# Altium footprint library Chip_Packaging.PcbLib: 101 footprints (part 1 of 7)
Each footprint in its own frame and in the unit in brackets; x right, y up, seen from the top. Pads: shape width x height; smd on the part's side, far side on the other; paste and mask are expansions set on the pad; w line width, h text height; cw(c..) or ccw(c..) is an arc to the next point about the centre after c.
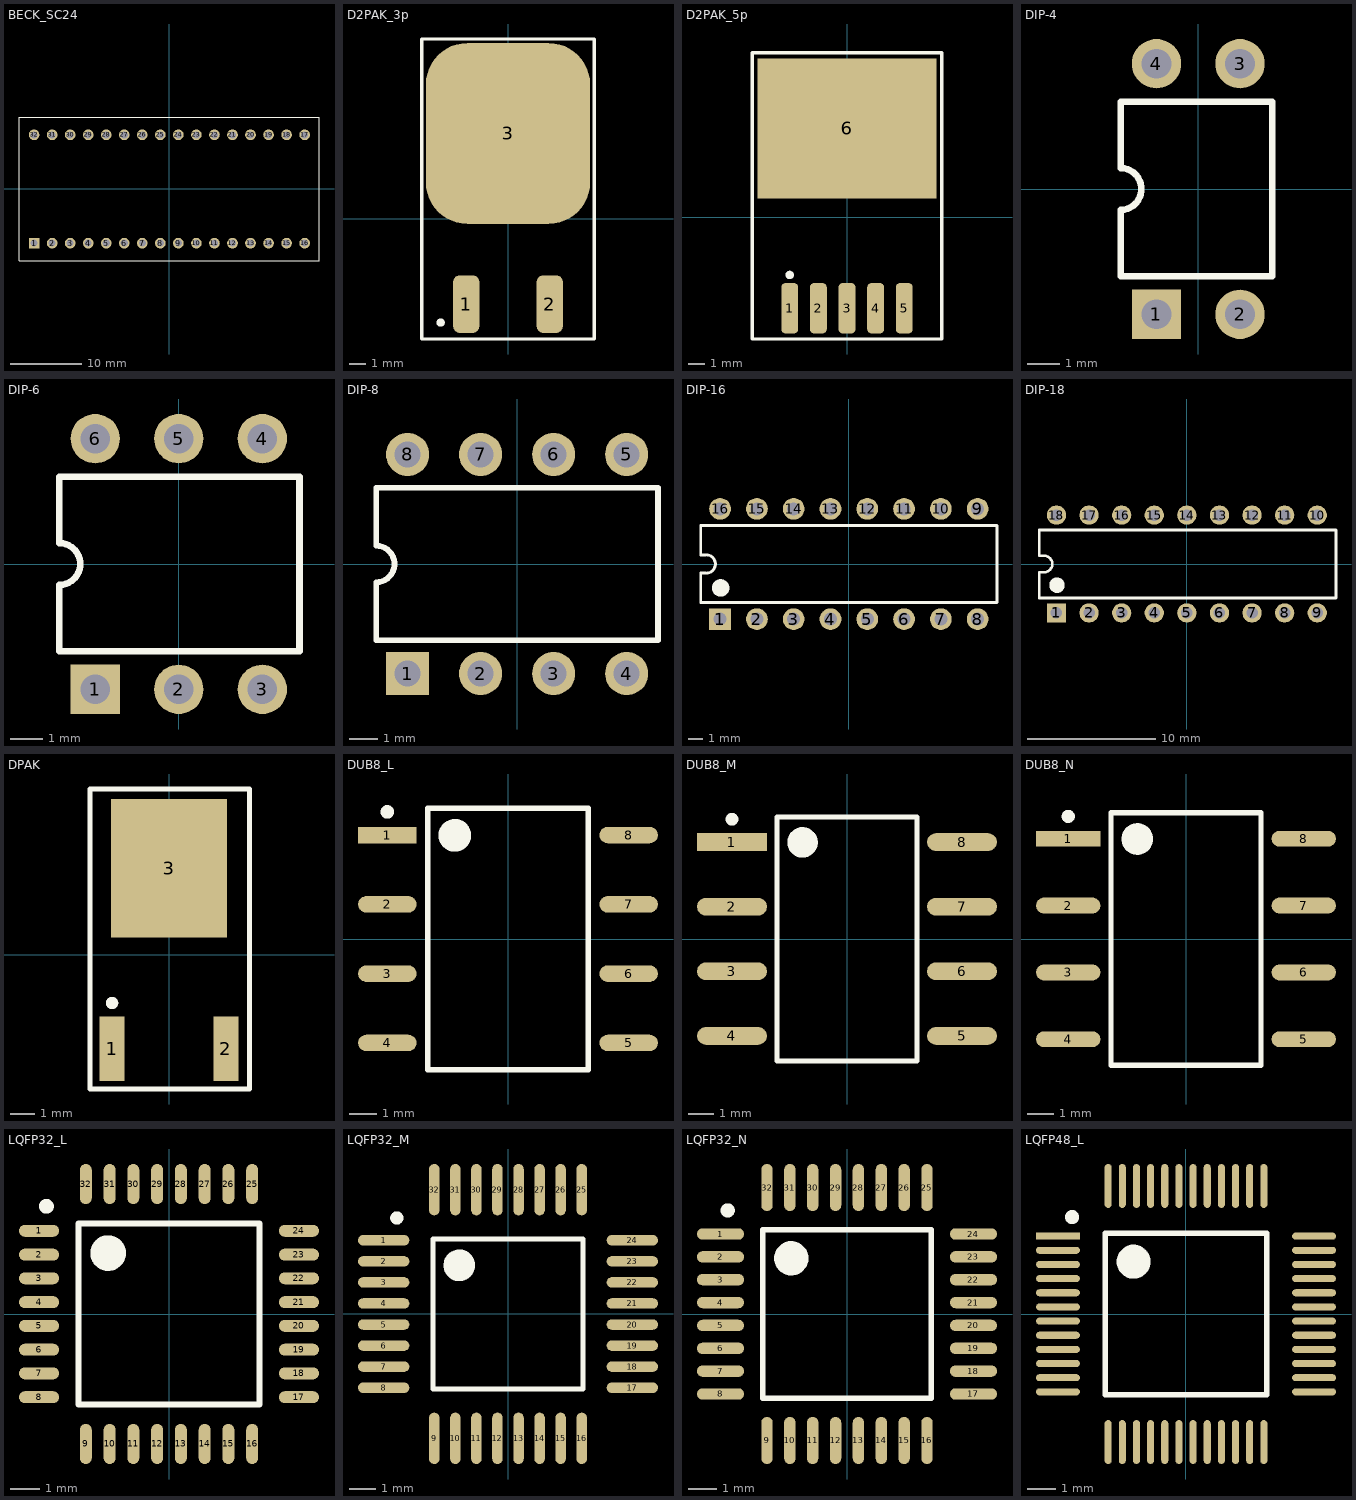
[diagram p0: the footprints below, top view; thin cyan lines are the x and y axes]

## BECK_SC24 [mm]
pads (32):
  rect 1.5x1.5 hole 1: 1(-19.05,-7.62)
  round 1.5 hole 1: 2(-16.51,-7.62) 3(-13.97,-7.62) 4(-11.43,-7.62) 5(-8.89,-7.62) 6(-6.35,-7.62) 7(-3.81,-7.62) 8(-1.27,-7.62) 9(1.27,-7.62) 10(3.81,-7.62) 11(6.35,-7.62) 12(8.89,-7.62) 13(11.43,-7.62) 14(13.97,-7.62) 15(16.51,-7.62) 16(19.05,-7.62) 17(19.05,7.62) 18(16.51,7.62) 19(13.97,7.62) 20(11.43,7.62) 21(8.89,7.62) 22(6.35,7.62) 23(3.81,7.62) 24(1.27,7.62) 25(-1.27,7.62) 26(-3.81,7.62) 27(-6.35,7.62) 28(-8.89,7.62) 29(-11.43,7.62) 30(-13.97,7.62) 31(-16.51,7.62) 32(-19.05,7.62)
Top Overlay:
  lines w0.1: -21.175,-10.125 -21.175,10.125 21.075,10.125 21.075,-10.125 -21.175,-10.125
3D body: height 9.5, standoff 8, extent 17,-5 20,-3.5
3D body: height 9.5, standoff 8, extent 5.5,-5 16,5.5
3D body: height 9.5, standoff 8, extent -5.5,-2.5 2.5,5
3D body: height 9.5, standoff 8, extent -17,-3.5 -9.5,4
3D body: height 8, standoff 6.5, extent -21.175,-10.125 21.075,10.125
3D body: height 6.5, standoff 0, extent 0.973,-7.919 1.57,-7.32
3D body: height 6.5, standoff 0, extent 3.513,-7.919 4.11,-7.32
3D body: height 6.5, standoff 0, extent 6.053,-7.919 6.65,-7.32
3D body: height 6.5, standoff 0, extent 8.593,-7.919 9.19,-7.32
3D body: height 6.5, standoff 0, extent -19.347,-7.919 -18.75,-7.32
3D body: height 6.5, standoff 0, extent -16.807,-7.919 -16.21,-7.32
3D body: height 6.5, standoff 0, extent -14.267,-7.919 -13.67,-7.32
3D body: height 6.5, standoff 0, extent -11.727,-7.919 -11.13,-7.32
3D body: height 6.5, standoff 0, extent -1.567,-7.919 -0.97,-7.32
3D body: height 6.5, standoff 0, extent -4.107,-7.919 -3.51,-7.32
3D body: height 6.5, standoff 0, extent -6.647,-7.919 -6.05,-7.32
3D body: height 6.5, standoff 0, extent -9.187,-7.919 -8.59,-7.32
3D body: height 6.5, standoff 0, extent 18.753,-7.919 19.35,-7.32
3D body: height 6.5, standoff 0, extent 16.213,-7.919 16.81,-7.32
3D body: height 6.5, standoff 0, extent 13.673,-7.919 14.27,-7.32
3D body: height 6.5, standoff 0, extent 11.133,-7.919 11.73,-7.32
3D body: height 6.5, standoff 0, extent 11.133,7.321 11.73,7.92
3D body: height 6.5, standoff 0, extent 13.673,7.321 14.27,7.92
3D body: height 6.5, standoff 0, extent 16.213,7.321 16.81,7.92
3D body: height 6.5, standoff 0, extent 18.753,7.321 19.35,7.92
3D body: height 6.5, standoff 0, extent -9.187,7.321 -8.59,7.92
3D body: height 6.5, standoff 0, extent -6.647,7.321 -6.05,7.92
3D body: height 6.5, standoff 0, extent -4.107,7.321 -3.51,7.92
3D body: height 6.5, standoff 0, extent -1.567,7.321 -0.97,7.92
3D body: height 6.5, standoff 0, extent -11.727,7.321 -11.13,7.92
3D body: height 6.5, standoff 0, extent -14.267,7.321 -13.67,7.92
3D body: height 6.5, standoff 0, extent -16.807,7.321 -16.21,7.92
3D body: height 6.5, standoff 0, extent -19.347,7.321 -18.75,7.92
3D body: height 6.5, standoff 0, extent 8.593,7.321 9.19,7.92
3D body: height 6.5, standoff 0, extent 6.053,7.321 6.65,7.92
3D body: height 6.5, standoff 0, extent 3.513,7.321 4.11,7.92
3D body: height 6.5, standoff 0, extent 0.973,7.321 1.57,7.92
3D body "DIP_panel_32.stp": height 4.3, standoff -3.07, extent -20.3,-8.85 20.3,8.85

## D2PAK_3p [mm] "D2-PAK; 5 Leads; Body 14.7 (inc. leads) x 10.2 mm (LxW max)"
height 4.58
pads (3):
  rrect50% 1.6x3.5 smd: 1(-2.54,-5.194) 2(2.54,-5.194)
  rrect50% 10x11 smd: 3(0,5.194)
Top Overlay:
  circle w0.25: c-4.1,-6.319 r0.125
  lines w0.2: -5.25,-7.319 5.25,-7.319 5.25,10.944 -5.25,10.944 -5.25,-7.319
3D body "D2PAK_3.STEP": height 4.88, standoff -0.13, extent -5.08,-5.835 5.08,9.429

## D2PAK_5p [mm] "D2-PAK; 5 Leads; Body 14.7 (inc. leads) x 10.2 mm (LxW max)"
height 4.58
pads (6):
  rrect50% 1x3 smd: 1(-3.4,-5.4) 2(-1.7,-5.4) 3(0,-5.4) 4(1.7,-5.4) 5(3.4,-5.4)
  rect 10.6x8.3 smd: 6(0,5.275)
Top Overlay:
  circle w0.25: c-3.4,-3.425 r0.125
  lines w0.2: -5.625,-7.225 5.625,-7.225 5.625,9.75 -5.625,9.75 -5.625,-7.225
3D body "D2PAK-5.STEP": height 4.78, standoff -0.02, extent -5,-6.59 5,9.08

## DIP-4 [mm]
height 4.2
pads (4):
  rect 1.5x1.5 hole 0.9: 1(-1.27,-3.81)
  round 1.5 hole 0.9: 2(1.27,-3.81) 3(1.27,3.81) 4(-1.27,3.81)
Top Overlay:
  lines w0.2: -2.36,-2.65 -2.36,-0.635 ccw(c-2.36,0) -2.36,0.635 -2.36,2.65 2.25,2.65 2.25,-2.65 -2.36,-2.65
3D body "DIP-4_DEFAULT.STEP": height 4.31, standoff -3.28, extent -2.815,-4.025 2.725,3.975

## DIP-6 [mm] "6-Pin Plastic Dual In-Line Package (PDIP)"
height 4.32
pads (6):
  rect 1.5x1.5 hole 0.9: 1(-2.54,-3.81)
  round 1.5 hole 0.9: 2(0,-3.81) 3(2.54,-3.81) 4(2.54,3.81) 5(0,3.81) 6(-2.54,3.81)
Top Overlay:
  lines w0.2: -3.63,-2.65 3.67,-2.65 3.67,2.65 -3.63,2.65 -3.63,0.635 cw(c-3.63,0) -3.63,-0.635 -3.63,-2.65
3D body "DIP-6.STEP": height 5.3, standoff -2, extent -3.53,-3.935 3.59,3.935

## DIP-8 [mm] "8-Pin Plastic Dual In-Line Package (PDIP)"
height 4.32
pads (8):
  rect 1.5x1.5 hole 0.9: 1(-3.81,-3.81)
  round 1.5 hole 0.9: 2(-1.27,-3.81) 3(1.27,-3.81) 4(3.81,-3.81) 5(3.81,3.81) 6(1.27,3.81) 7(-1.27,3.81) 8(-3.81,3.81)
Top Overlay:
  lines w0.2: -4.9,-2.65 -4.9,-0.635 ccw(c-4.9,0) -4.9,0.635 -4.9,2.65 4.9,2.65 4.9,-2.65 -4.9,-2.65
3D body "DIP-8.STEP": height 4.57, standoff -3.81, extent -4.955,-3.91 4.955,3.91

## DIP-16 [mm] "DIP, 16-Leads, Row Spacing 7.62mm, Pitch 2.54mm, Body 19.3x6.4mm"
height 5.08
pads (16):
  rect 1.5x1.5 hole 0.9: 1(-8.89,-3.81)
  round 1.5 hole 0.9: 2(-6.35,-3.81) 3(-3.81,-3.81) 4(-1.27,-3.81) 5(1.27,-3.81) 6(3.81,-3.81) 7(6.35,-3.81) 8(8.89,-3.81) 9(8.89,3.81) 10(6.35,3.81) 11(3.81,3.81) 12(1.27,3.81) 13(-1.27,3.81) 14(-3.81,3.81) 15(-6.35,3.81) 16(-8.89,3.81)
Top Overlay:
  circle w0.6: c-8.85,-1.65 r0.3
  lines w0.2: -10.225,-2.65 10.225,-2.65 10.225,2.65 -10.225,2.65 -10.225,0.635 -9.85,0.635 cw(c-9.85,0) -9.85,-0.635 -10.225,-0.635 -10.225,-2.65
3D body "DIP-16.STEP": height 4.5, standoff -3.5, extent -10.3,-3.88 10.3,3.88

## DIP-18 [mm] "DIP, 18-Leads, Row Spacing 7.62mm, Pitch 2.54mm, Body 19.3x6.4mm"
height 5.08
pads (18):
  rect 1.5x1.5 hole 0.9: 1(-10.16,-3.81)
  round 1.5 hole 0.9: 2(-7.62,-3.81) 3(-5.08,-3.81) 4(-2.54,-3.81) 5(0,-3.81) 6(2.54,-3.81) 7(5.08,-3.81) 8(7.62,-3.81) 9(10.16,-3.81) 10(10.16,3.81) 11(7.62,3.81) 12(5.08,3.81) 13(2.54,3.81) 14(0,3.81) 15(-2.54,3.81) 16(-5.08,3.81) 17(-7.62,3.81) 18(-10.16,3.81)
Top Overlay:
  circle w0.6: c-10.12,-1.65 r0.3
  lines w0.2: -11.5,0.635 -11.12,0.635 cw(c-11.12,0) -11.12,-0.635 -11.495,-0.635 -11.495,-2.65 11.62,-2.65 11.62,2.65 -11.5,2.65 -11.5,0.635
3D body "DIP-18.STEP": height 4.57, standoff -3.81, extent -11.62,-3.91 11.62,3.91

## DPAK [mm] "D2-PAK; 3"
height 4.58
pads (3):
  rect 1x2.6 smd: 1(-2.3,-3.8) 2(2.3,-3.8)
  rect 4.7x5.6 smd: 3(0,3.5)
Top Overlay:
  circle w0.25: c-2.3,-1.95 r0.125
  lines w0.2: -3.2,-5.425 3.25,-5.425 3.25,6.7 -3.2,6.7 -3.2,-5.425
3D body "DPAK-1.STEP": height 2.44, standoff 0.03, extent -3.27,-4.211 3.27,5.728

## DUB8_L [mm] "SOP, 8-Leads, Body 9.5x6.62mm, Pitch 2.54mm, IPC High Density"
height 4.85
pads (8):
  rect 2.15x0.6 smd: 1(-4.425,3.81)
  oval 2.15x0.6 smd: 2(-4.425,1.27) 3(-4.425,-1.27) 4(-4.425,-3.81) 5(4.425,-3.81) 6(4.425,-1.27) 7(4.425,1.27) 8(4.425,3.81)
Top Overlay:
  circle w0.25: c-4.425,4.66 r0.125
  circle w0.6: c-1.95,3.8 r0.3
  lines w0.2: -2.95,-4.8 -2.95,4.8 2.95,4.8 2.95,-4.8 -2.95,-4.8
3D body "DUB8.STEP": height 0, standoff 0, extent 1275.025,1253.125 1275.025,1253.125
3D body "DUB8.STEP": height 0, standoff 0, extent 1274.05,1258.975 1274.05,1258.975
3D body "DUB8.STEP": height 0, standoff 0, extent 1272.75,1260.025 1272.75,1260.025
3D body "DUB8.STEP": height 0, standoff 0, extent 1272.65,1260.075 1272.65,1260.075
3D body "DUB8_2.STEP": height 0, standoff 0, extent 1276.825,1257.65 1276.825,1257.65
3D body "DUB8.STEP": height 4.35, standoff 0.02, extent -4.95,-4.95 4.95,4.95

## DUB8_M [mm] "SOP, 8-Leads, Body 9.5x6.62mm, Pitch 2.54mm, IPC Low Density"
height 4.85
pads (8):
  rect 2.75x0.7 smd: 1(-4.525,3.81)
  oval 2.75x0.7 smd: 2(-4.525,1.27) 3(-4.525,-1.27) 4(-4.525,-3.81) 5(4.525,-3.81) 6(4.525,-1.27) 7(4.525,1.27) 8(4.525,3.81)
Top Overlay:
  circle w0.6: c-1.75,3.8 r0.3
  circle w0.25: c-4.525,4.71 r0.125
  lines w0.2: -2.75,-4.8 2.75,-4.8 2.75,4.8 -2.75,4.8 -2.75,-4.8
3D body "DUB8.STEP": height 4.35, standoff 0.02, extent -4.95,-4.95 4.95,4.95

## DUB8_N [mm] "SOP, 8-Leads, Body 9.5x6.62mm, Pitch 2.54mm, IPC Medium Density"
height 4.85
pads (8):
  rect 2.45x0.6 smd: 1(-4.475,3.81)
  oval 2.45x0.6 smd: 2(-4.475,1.27) 3(-4.475,-1.27) 4(-4.475,-3.81) 5(4.475,-3.81) 6(4.475,-1.27) 7(4.475,1.27) 8(4.475,3.81)
Top Overlay:
  circle w0.25: c-4.475,4.66 r0.125
  circle w0.6: c-1.85,3.8 r0.3
  lines w0.2: -2.85,-4.8 -2.85,4.8 2.85,4.8 2.85,-4.8 -2.85,-4.8
3D body "DUB8.STEP": height 4.35, standoff 0.02, extent -4.95,-4.95 4.95,4.95

## LQFP32_L [mm] "QFP, 32-Leads, Body 7x7mm, Pitch 0.8mm, IPC High Density"
height 1.6
pads (32):
  oval 1.35x0.4 smd: 1(-4.375,2.8) 2(-4.375,2) 3(-4.375,1.2) 4(-4.375,0.4) 5(-4.375,-0.4) 6(-4.375,-1.2) 7(-4.375,-2) 8(-4.375,-2.8) 17(4.375,-2.8) 18(4.375,-2) 19(4.375,-1.2) 20(4.375,-0.4) 21(4.375,0.4) 22(4.375,1.2) 23(4.375,2) 24(4.375,2.8)
  oval 0.4x1.35 smd: 9(-2.8,-4.375) 10(-2,-4.375) 11(-1.2,-4.375) 12(-0.4,-4.375) 13(0.4,-4.375) 14(1.2,-4.375) 15(2,-4.375) 16(2.8,-4.375) 25(2.8,4.375) 26(2,4.375) 27(1.2,4.375) 28(0.4,4.375) 29(-0.4,4.375) 30(-1.2,4.375) 31(-2,4.375) 32(-2.8,4.375)
Top Overlay:
  circle w0.6: c-2.05,2.05 r0.3
  circle w0.25: c-4.125,3.625 r0.125
  lines w0.2: -3.05,-3.05 3.05,-3.05 3.05,3.05 -3.05,3.05 -3.05,-3.05
3D body "LQFP32.STEP": height 1.62, standoff -0.01, extent -4.572,-4.572 4.572,4.572

## LQFP32_M [mm] "QFP, 32-Leads, Body 7x7mm, Pitch 0.8mm, IPC Low Density"
height 1.6
pads (32):
  oval 1.95x0.4 smd: 1(-4.725,2.8) 2(-4.725,2) 3(-4.725,1.2) 4(-4.725,0.4) 5(-4.725,-0.4) 6(-4.725,-1.2) 7(-4.725,-2) 8(-4.725,-2.8) 17(4.725,-2.8) 18(4.725,-2) 19(4.725,-1.2) 20(4.725,-0.4) 21(4.725,0.4) 22(4.725,1.2) 23(4.725,2) 24(4.725,2.8)
  oval 0.4x1.95 smd: 9(-2.8,-4.725) 10(-2,-4.725) 11(-1.2,-4.725) 12(-0.4,-4.725) 13(0.4,-4.725) 14(1.2,-4.725) 15(2,-4.725) 16(2.8,-4.725) 25(2.8,4.725) 26(2,4.725) 27(1.2,4.725) 28(0.4,4.725) 29(-0.4,4.725) 30(-1.2,4.725) 31(-2,4.725) 32(-2.8,4.725)
Top Overlay:
  circle w0.25: c-4.225,3.65 r0.125
  circle w0.6: c-1.85,1.85 r0.3
  lines w0.2: -2.85,-2.85 -2.85,2.85 2.85,2.85 2.85,-2.85 -2.85,-2.85
3D body "LQFP32.STEP": height 1.62, standoff -0.01, extent -4.572,-4.572 4.572,4.572

## LQFP32_N [mm] "QFP, 32-Leads, Body 7x7mm, Pitch 0.8mm, IPC Medium Density"
height 1.6
pads (32):
  oval 1.65x0.4 smd: 1(-4.425,2.8) 2(-4.425,2) 3(-4.425,1.2) 4(-4.425,0.4) 5(-4.425,-0.4) 6(-4.425,-1.2) 7(-4.425,-2) 8(-4.425,-2.8) 17(4.425,-2.8) 18(4.425,-2) 19(4.425,-1.2) 20(4.425,-0.4) 21(4.425,0.4) 22(4.425,1.2) 23(4.425,2) 24(4.425,2.8)
  oval 0.4x1.65 smd: 9(-2.8,-4.425) 10(-2,-4.425) 11(-1.2,-4.425) 12(-0.4,-4.425) 13(0.4,-4.425) 14(1.2,-4.425) 15(2,-4.425) 16(2.8,-4.425) 25(2.8,4.425) 26(2,4.425) 27(1.2,4.425) 28(0.4,4.425) 29(-0.4,4.425) 30(-1.2,4.425) 31(-2,4.425) 32(-2.8,4.425)
Top Overlay:
  circle w0.25: c-4.175,3.625 r0.125
  circle w0.6: c-1.95,1.95 r0.3
  lines w0.2: -2.95,-2.95 -2.95,2.95 2.95,2.95 2.95,-2.95 -2.95,-2.95
3D body "LQFP32.STEP": height 1.62, standoff -0.01, extent -4.572,-4.572 4.572,4.572

## LQFP48_L [mm] "Thin QFP, 48-Leads, Body 7x7mm, Pitch 0.5mm, IPC High Density"
height 1.6
pads (48):
  rect 1.55x0.25 smd: 1(-4.525,2.75)
  oval 1.55x0.25 smd: 2(-4.525,2.25) 3(-4.525,1.75) 4(-4.525,1.25) 5(-4.525,0.75) 6(-4.525,0.25) 7(-4.525,-0.25) 8(-4.525,-0.75) 9(-4.525,-1.25) 10(-4.525,-1.75) 11(-4.525,-2.25) 12(-4.525,-2.75) 25(4.525,-2.75) 26(4.525,-2.25) 27(4.525,-1.75) 28(4.525,-1.25) 29(4.525,-0.75) 30(4.525,-0.25) 31(4.525,0.25) 32(4.525,0.75) 33(4.525,1.25) 34(4.525,1.75) 35(4.525,2.25) 36(4.525,2.75)
  oval 0.25x1.55 smd: 13(-2.75,-4.525) 14(-2.25,-4.525) 15(-1.75,-4.525) 16(-1.25,-4.525) 17(-0.75,-4.525) 18(-0.25,-4.525) 19(0.25,-4.525) 20(0.75,-4.525) 21(1.25,-4.525) 22(1.75,-4.525) 23(2.25,-4.525) 24(2.75,-4.525) 37(2.75,4.525) 38(2.25,4.525) 39(1.75,4.525) 40(1.25,4.525) 41(0.75,4.525) 42(0.25,4.525) 43(-0.25,4.525) 44(-0.75,4.525) 45(-1.25,4.525) 46(-1.75,4.525) 47(-2.25,4.525) 48(-2.75,4.525)
Top Overlay:
  circle w0.25: c-4.025,3.425 r0.125
  circle w0.6: c-1.85,1.85 r0.3
  lines w0.2: -2.85,-2.85 -2.85,2.85 2.85,2.85 2.85,-2.85 -2.85,-2.85
3D body "LQFP48.STEP": height 1.6, standoff 0, extent -4.5,-4.5 4.5,4.5